# Altium schematic symbol library LATTICEPLDS_Library.SchLib: 291 symbols (part 7 of 32)
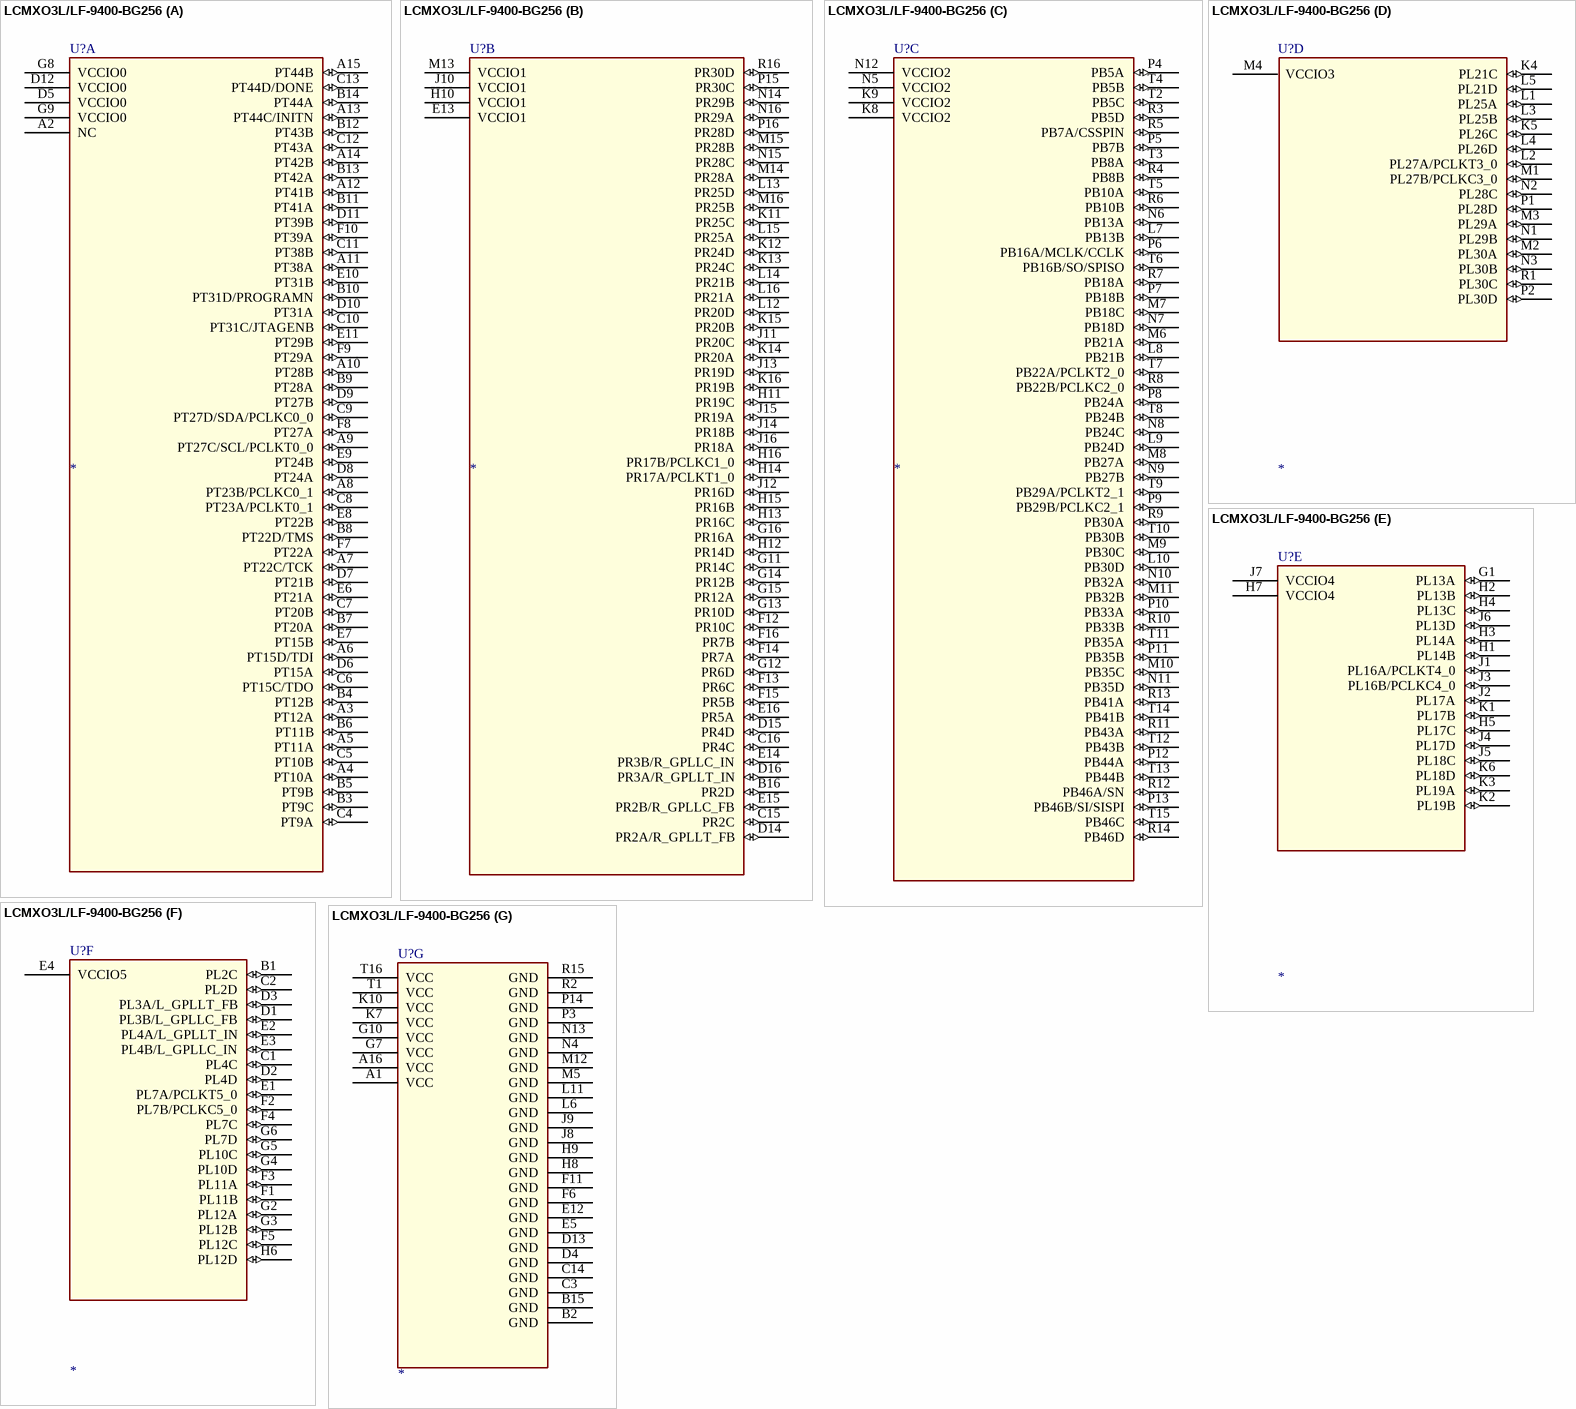
[diagram p309: symbol LCMXO3L/LF-9400-BG256]

## LCMXO3L/LF-9400-BG256
designator U?
SWAP_INFO: (S1+S2+S3+S4+S5+S6+S7); SPLIT_INST: TRUE
part A pins: A2 NC, A3 PT12A (io), A4 PT10A (io), A5 PT11A (io), A6 PT15D/TDI (io), A7 PT22C/TCK (io), A8 PT23B/PCLKC0_1 (io), A9 PT27C/SCL/PCLKT0_0 (io), A10 PT28B (io), A11 PT38A (io), A12 PT41B (io), A13 PT44C/INITN (io), A14 PT42B (io), A15 PT44B (io), B3 PT9C (io), B4 PT12B (io), B5 PT9B (io), B6 PT11B (io), B7 PT20A (io), B8 PT22D/TMS (io), B9 PT28A (io), B10 PT31D/PROGRAMN (io), B11 PT41A (io), B12 PT43B (io), B13 PT42A (io), B14 PT44A (io), C4 PT9A (io), C5 PT10B (io), C6 PT15C/TDO (io), C7 PT20B (io), C8 PT23A/PCLKT0_1 (io), C9 PT27D/SDA/PCLKC0_0 (io), C10 PT31C/JTAGENB (io), C11 PT38B (io), C12 PT43A (io), C13 PT44D/DONE (io), D5 VCCIO0 (power), D6 PT15A (io), D7 PT21B (io), D8 PT24A (io), D9 PT27B (io), D10 PT31A (io), D11 PT39B (io), D12 VCCIO0 (power), E6 PT21A (io), E7 PT15B (io), E8 PT22B (io), E9 PT24B (io), E10 PT31B (io), E11 PT29B (io), F7 PT22A (io), F8 PT27A (io), F9 PT29A (io), F10 PT39A (io), G8 VCCIO0 (power), G9 VCCIO0 (power)
part B pins: B16 PR2D (io), C15 PR2C (io), C16 PR4C (io), D14 PR2A/R_GPLLT_FB (io), D15 PR4D (io), D16 PR3A/R_GPLLT_IN (io), E13 VCCIO1 (power), E14 PR3B/R_GPLLC_IN (io), E15 PR2B/R_GPLLC_FB (io), E16 PR5A (io), F12 PR10C (io), F13 PR6C (io), F14 PR7A (io), F15 PR5B (io), F16 PR7B (io), G11 PR14C (io), G12 PR6D (io), G13 PR10D (io), G14 PR12B (io), G15 PR12A (io), G16 PR16A (io), H10 VCCIO1 (power), H11 PR19C (io), H12 PR14D (io), H13 PR16C (io), H14 PR17A/PCLKT1_0 (io), H15 PR16B (io), H16 PR17B/PCLKC1_0 (io), J10 VCCIO1 (power), J11 PR20C (io), J12 PR16D (io), J13 PR19D (io), J14 PR18B (io), J15 PR19A (io), J16 PR18A (io), K11 PR25C (io), K12 PR24D (io), K13 PR24C (io), K14 PR20A (io), K15 PR20B (io), K16 PR19B (io), L12 PR20D (io), L13 PR25D (io), L14 PR21B (io), L15 PR25A (io), L16 PR21A (io), M13 VCCIO1 (power), M14 PR28A (io), M15 PR28B (io), M16 PR25B (io), N14 PR29B (io), N15 PR28C (io), N16 PR29A (io), P15 PR30C (io), P16 PR28D (io), R16 PR30D (io)
part C pins: K8 VCCIO2 (power), K9 VCCIO2 (power), L7 PB13B (io), L8 PB21B (io), L9 PB24D (io), L10 PB30D (io), M6 PB21A (io), M7 PB18C (io), M8 PB27A (io), M9 PB30C (io), M10 PB35C (io), M11 PB32B (io), N5 VCCIO2 (power), N6 PB13A (io), N7 PB18D (io), N8 PB24C (io), N9 PB27B (io), N10 PB32A (io), N11 PB35D (io), N12 VCCIO2 (power), P4 PB5A (io), P5 PB7B (io), P6 PB16A/MCLK/CCLK (io), P7 PB18B (io), P8 PB24A (io), P9 PB29B/PCLKC2_1 (io), P10 PB33A (io), P11 PB35B (io), P12 PB44A (io), P13 PB46B/SI/SISPI (io), R3 PB5D (io), R4 PB8B (io), R5 PB7A/CSSPIN (io), R6 PB10B (io), R7 PB18A (io), R8 PB22B/PCLKC2_0 (io), R9 PB30A (io), R10 PB33B (io), R11 PB43A (io), R12 PB46A/SN (io), R13 PB41A (io), R14 PB46D (io), T2 PB5C (io), T3 PB8A (io), T4 PB5B (io), T5 PB10A (io), T6 PB16B/SO/SPISO (io), T7 PB22A/PCLKT2_0 (io), T8 PB24B (io), T9 PB29A/PCLKT2_1 (io), T10 PB30B (io), T11 PB35A (io), T12 PB43B (io), T13 PB44B (io), T14 PB41B (io), T15 PB46C (io)
part D pins: K4 PL21C (io), K5 PL26C (io), L1 PL25A (io), L2 PL27A/PCLKT3_0 (io), L3 PL25B (io), L4 PL26D (io), L5 PL21D (io), M1 PL27B/PCLKC3_0 (io), M2 PL30A (io), M3 PL29A (io), M4 VCCIO3 (power), N1 PL29B (io), N2 PL28C (io), N3 PL30B (io), P1 PL28D (io), P2 PL30D (io), R1 PL30C (io)
part E pins: G1 PL13A (io), H1 PL14B (io), H2 PL13B (io), H3 PL14A (io), H4 PL13C (io), H5 PL17C (io), H7 VCCIO4 (power), J1 PL16A/PCLKT4_0 (io), J2 PL17A (io), J3 PL16B/PCLKC4_0 (io), J4 PL17D (io), J5 PL18C (io), J6 PL13D (io), J7 VCCIO4 (power), K1 PL17B (io), K2 PL19B (io), K3 PL19A (io), K6 PL18D (io)
part F pins: B1 PL2C (io), C1 PL4C (io), C2 PL2D (io), D1 PL3B/L_GPLLC_FB (io), D2 PL4D (io), D3 PL3A/L_GPLLT_FB (io), E1 PL7A/PCLKT5_0 (io), E2 PL4A/L_GPLLT_IN (io), E3 PL4B/L_GPLLC_IN (io), E4 VCCIO5 (power), F1 PL11B (io), F2 PL7B/PCLKC5_0 (io), F3 PL11A (io), F4 PL7C (io), F5 PL12C (io), G2 PL12A (io), G3 PL12B (io), G4 PL10D (io), G5 PL10C (io), G6 PL7D (io), H6 PL12D (io)
part G pins: A1 VCC (power), A16 VCC (power), B2 GND (power), B15 GND (power), C3 GND (power), C14 GND (power), D4 GND (power), D13 GND (power), E5 GND (power), E12 GND (power), F6 GND (power), F11 GND (power), G7 VCC (power), G10 VCC (power), H8 GND (power), H9 GND (power), J8 GND (power), J9 GND (power), K7 VCC (power), K10 VCC (power), L6 GND (power), L11 GND (power), M5 GND (power), M12 GND (power), N4 GND (power), N13 GND (power), P3 GND (power), P14 GND (power), R2 GND (power), R15 GND (power), T1 VCC (power), T16 VCC (power)

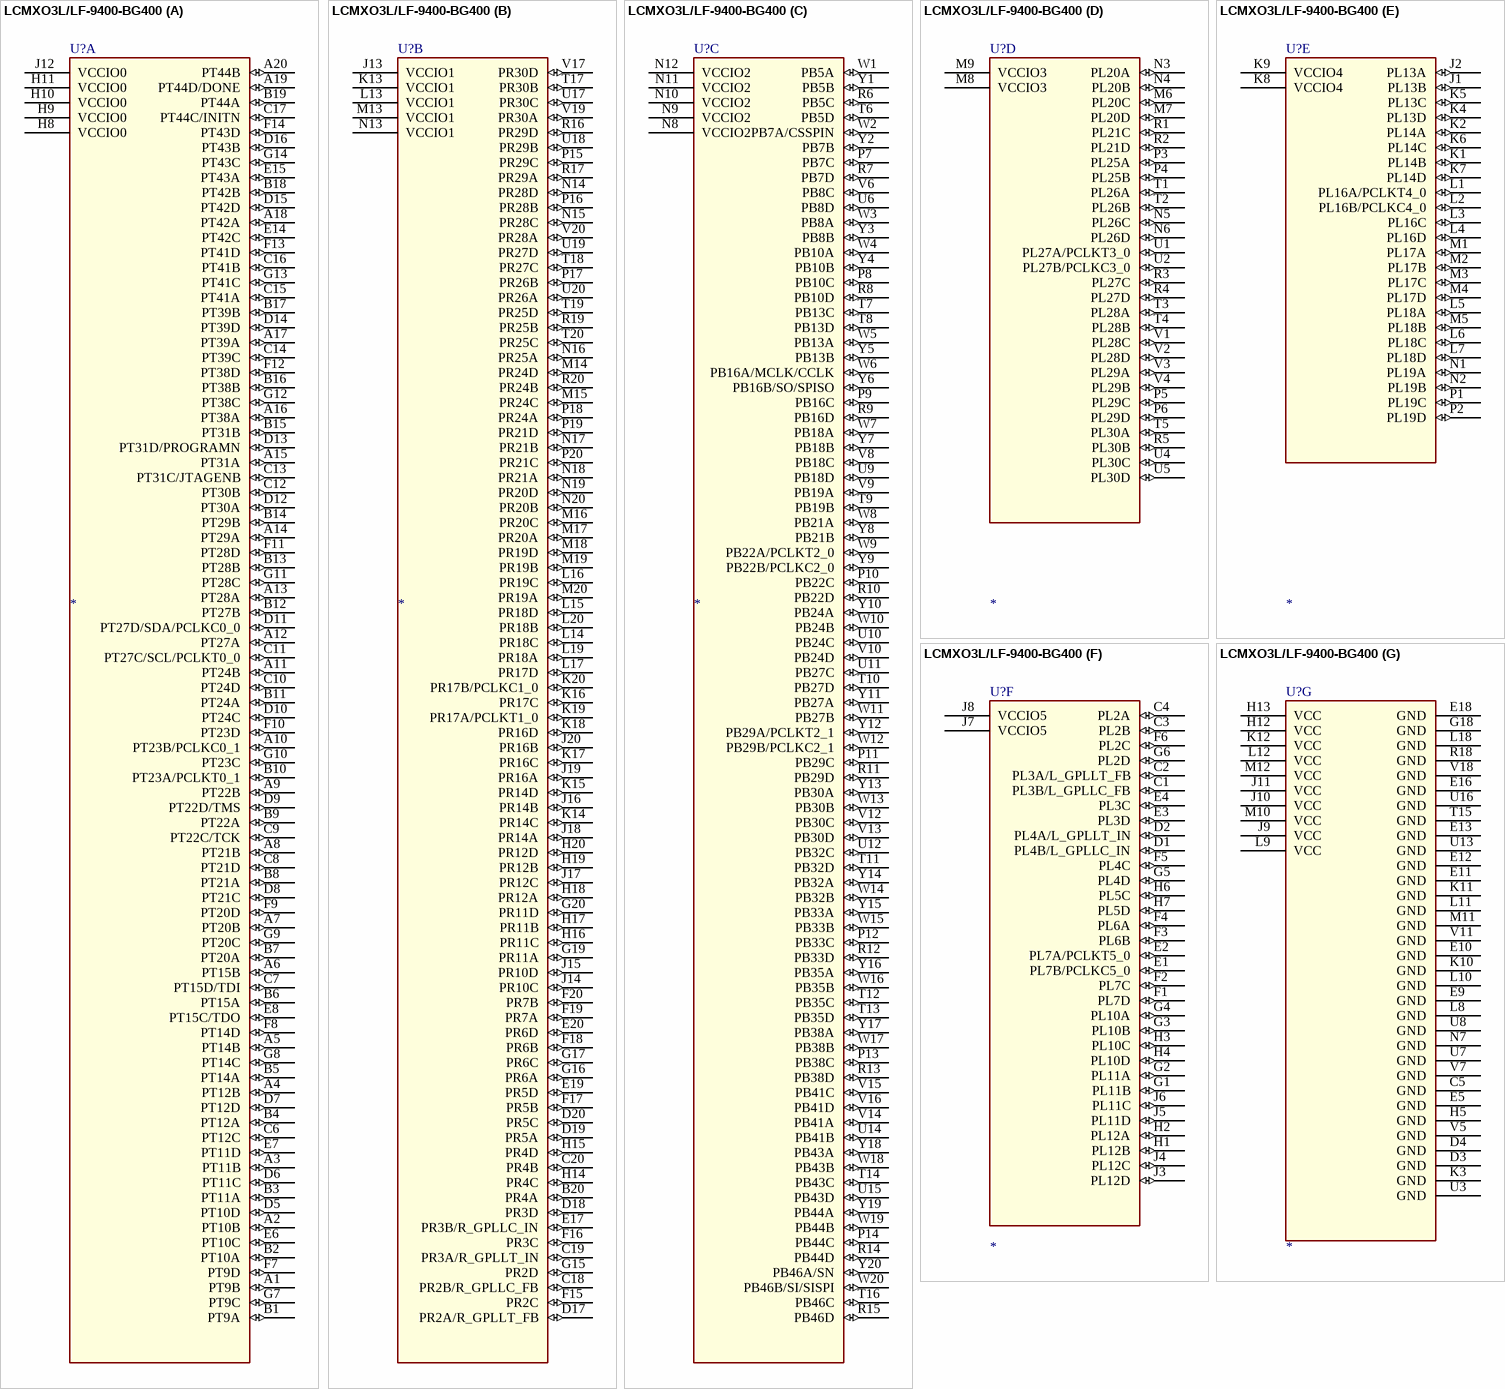
[diagram p65: symbol LCMXO3L/LF-9400-BG400]

## LCMXO3L/LF-9400-BG400
designator U?
SWAP_INFO: (S1+S2+S3+S4+S5+S6+S7); SPLIT_INST: TRUE
part A pins: A1 PT9B (io), A2 PT10B (io), A3 PT11B (io), A4 PT12B (io), A5 PT14B (io), A6 PT15B (io), A7 PT20B (io), A8 PT21B (io), A9 PT22B (io), A10 PT23B/PCLKC0_1 (io), A11 PT24B (io), A12 PT27A (io), A13 PT28A (io), A14 PT29A (io), A15 PT31A (io), A16 PT38A (io), A17 PT39A (io), A18 PT42A (io), A19 PT44D/DONE (io), A20 PT44B (io), B1 PT9A (io), B2 PT10A (io), B3 PT11A (io), B4 PT12A (io), B5 PT14A (io), B6 PT15A (io), B7 PT20A (io), B8 PT21A (io), B9 PT22A (io), B10 PT23A/PCLKT0_1 (io), B11 PT24A (io), B12 PT27B (io), B13 PT28B (io), B14 PT29B (io), B15 PT31B (io), B16 PT38B (io), B17 PT39B (io), B18 PT42B (io), B19 PT44A (io), C6 PT12C (io), C7 PT15D/TDI (io), C8 PT21D (io), C9 PT22C/TCK (io), C10 PT24D (io), C11 PT27C/SCL/PCLKT0_0 (io), C12 PT30B (io), C13 PT31C/JTAGENB (io), C14 PT39C (io), C15 PT41A (io), C16 PT41B (io), C17 PT44C/INITN (io), D5 PT10D (io), D6 PT11C (io), D7 PT12D (io), D8 PT21C (io), D9 PT22D/TMS (io), D10 PT24C (io), D11 PT27D/SDA/PCLKC0_0 (io), D12 PT30A (io), D13 PT31D/PROGRAMN (io), D14 PT39D (io), D15 PT42D (io), D16 PT43B (io), E6 PT10C (io), E7 PT11D (io), E8 PT15C/TDO (io), E14 PT42C (io), E15 PT43A (io), F7 PT9D (io), F8 PT14D (io), F9 PT20D (io), F10 PT23D (io), F11 PT28D (io), F12 PT38D (io), F13 PT41D (io), F14 PT43D (io), G7 PT9C (io), G8 PT14C (io), G9 PT20C (io), G10 PT23C (io), G11 PT28C (io), G12 PT38C (io), G13 PT41C (io), G14 PT43C (io), H8 VCCIO0 (power), H9 VCCIO0 (power), H10 VCCIO0 (power), H11 VCCIO0 (power), J12 VCCIO0 (power)
part B pins: B20 PR4A (io), C18 PR2B/R_GPLLC_FB (io), C19 PR3A/R_GPLLT_IN (io), C20 PR4B (io), D17 PR2A/R_GPLLT_FB (io), D18 PR3D (io), D19 PR5A (io), D20 PR5C (io), E17 PR3B/R_GPLLC_IN (io), E19 PR5D (io), E20 PR6D (io), F15 PR2C (io), F16 PR3C (io), F17 PR5B (io), F18 PR6B (io), F19 PR7A (io), F20 PR7B (io), G15 PR2D (io), G16 PR6A (io), G17 PR6C (io), G19 PR11A (io), G20 PR11D (io), H14 PR4C (io), H15 PR4D (io), H16 PR11C (io), H17 PR11B (io), H18 PR12A (io), H19 PR12B (io), H20 PR12D (io), J13 VCCIO1 (power), J14 PR10C (io), J15 PR10D (io), J16 PR14B (io), J17 PR12C (io), J18 PR14A (io), J19 PR16A (io), J20 PR16B (io), K13 VCCIO1 (power), K14 PR14C (io), K15 PR14D (io), K16 PR17C (io), K17 PR16C (io), K18 PR16D (io), K19 PR17A/PCLKT1_0 (io), K20 PR17B/PCLKC1_0 (io), L13 VCCIO1 (power), L14 PR18C (io), L15 PR18D (io), L16 PR19C (io), L17 PR17D (io), L19 PR18A (io), L20 PR18B (io), M13 VCCIO1 (power), M14 PR24D (io), M15 PR24C (io), M16 PR20C (io), M17 PR20A (io), M18 PR19D (io), M19 PR19B (io), M20 PR19A (io), N13 VCCIO1 (power), N14 PR28D (io), N15 PR28C (io), N16 PR25A (io), N17 PR21B (io), N18 PR21A (io), N19 PR20D (io), N20 PR20B (io), P15 PR29C (io), P16 PR28B (io), P17 PR26B (io), P18 PR24A (io), P19 PR21D (io), P20 PR21C (io), R16 PR29D (io), R17 PR29A (io), R19 PR25B (io), R20 PR24B (io), T17 PR30B (io), T18 PR27C (io), T19 PR25D (io), T20 PR25C (io), U17 PR30C (io), U18 PR29B (io), U19 PR27D (io), U20 PR26A (io), V17 PR30D (io), V19 PR30A (io), V20 PR28A (io)
part C pins: N8 VCCIO2 (power), N9 VCCIO2 (power), N10 VCCIO2 (power), N11 VCCIO2 (power), N12 VCCIO2 (power), P7 PB7C (io), P8 PB10C (io), P9 PB16C (io), P10 PB22C (io), P11 PB29C (io), P12 PB33C (io), P13 PB38C (io), P14 PB44C (io), R6 PB5C (io), R7 PB7D (io), R8 PB10D (io), R9 PB16D (io), R10 PB22D (io), R11 PB29D (io), R12 PB33D (io), R13 PB38D (io), R14 PB44D (io), R15 PB46D (io), T6 PB5D (io), T7 PB13C (io), T8 PB13D (io), T9 PB19B (io), T10 PB27D (io), T11 PB32D (io), T12 PB35C (io), T13 PB35D (io), T14 PB43C (io), T16 PB46C (io), U6 PB8D (io), U9 PB18D (io), U10 PB24C (io), U11 PB27C (io), U12 PB32C (io), U14 PB41B (io), U15 PB43D (io), V6 PB8C (io), V8 PB18C (io), V9 PB19A (io), V10 PB24D (io), V12 PB30C (io), V13 PB30D (io), V14 PB41A (io), V15 PB41C (io), V16 PB41D (io), W1 PB5A (io), W2 PB7A/CSSPIN (io), W3 PB8A (io), W4 PB10A (io), W5 PB13A (io), W6 PB16A/MCLK/CCLK (io), W7 PB18A (io), W8 PB21A (io), W9 PB22A/PCLKT2_0 (io), W10 PB24B (io), W11 PB27B (io), W12 PB29B/PCLKC2_1 (io), W13 PB30B (io), W14 PB32B (io), W15 PB33B (io), W16 PB35B (io), W17 PB38B (io), W18 PB43B (io), W19 PB44B (io), W20 PB46B/SI/SISPI (io), Y1 PB5B (io), Y2 PB7B (io), Y3 PB8B (io), Y4 PB10B (io), Y5 PB13B (io), Y6 PB16B/SO/SPISO (io), Y7 PB18B (io), Y8 PB21B (io), Y9 PB22B/PCLKC2_0 (io), Y10 PB24A (io), Y11 PB27A (io), Y12 PB29A/PCLKT2_1 (io), Y13 PB30A (io), Y14 PB32A (io), Y15 PB33A (io), Y16 PB35A (io), Y17 PB38A (io), Y18 PB43A (io), Y19 PB44A (io), Y20 PB46A/SN (io)
part D pins: M6 PL20C (io), M7 PL20D (io), M8 VCCIO3 (power), M9 VCCIO3 (power), N3 PL20A (io), N4 PL20B (io), N5 PL26C (io), N6 PL26D (io), P3 PL25A (io), P4 PL25B (io), P5 PL29C (io), P6 PL29D (io), R1 PL21C (io), R2 PL21D (io), R3 PL27C (io), R4 PL27D (io), R5 PL30B (io), T1 PL26A (io), T2 PL26B (io), T3 PL28A (io), T4 PL28B (io), T5 PL30A (io), U1 PL27A/PCLKT3_0 (io), U2 PL27B/PCLKC3_0 (io), U4 PL30C (io), U5 PL30D (io), V1 PL28C (io), V2 PL28D (io), V3 PL29A (io), V4 PL29B (io)
part E pins: J1 PL13B (io), J2 PL13A (io), K1 PL14B (io), K2 PL14A (io), K4 PL13D (io), K5 PL13C (io), K6 PL14C (io), K7 PL14D (io), K8 VCCIO4 (power), K9 VCCIO4 (power), L1 PL16A/PCLKT4_0 (io), L2 PL16B/PCLKC4_0 (io), L3 PL16C (io), L4 PL16D (io), L5 PL18A (io), L6 PL18C (io), L7 PL18D (io), M1 PL17A (io), M2 PL17B (io), M3 PL17C (io), M4 PL17D (io), M5 PL18B (io), N1 PL19A (io), N2 PL19B (io), P1 PL19C (io), P2 PL19D (io)
part F pins: C1 PL3B/L_GPLLC_FB (io), C2 PL3A/L_GPLLT_FB (io), C3 PL2B (io), C4 PL2A (io), D1 PL4B/L_GPLLC_IN (io), D2 PL4A/L_GPLLT_IN (io), E1 PL7B/PCLKC5_0 (io), E2 PL7A/PCLKT5_0 (io), E3 PL3D (io), E4 PL3C (io), F1 PL7D (io), F2 PL7C (io), F3 PL6B (io), F4 PL6A (io), F5 PL4C (io), F6 PL2C (io), G1 PL11B (io), G2 PL11A (io), G3 PL10B (io), G4 PL10A (io), G5 PL4D (io), G6 PL2D (io), H1 PL12B (io), H2 PL12A (io), H3 PL10C (io), H4 PL10D (io), H6 PL5C (io), H7 PL5D (io), J3 PL12D (io), J4 PL12C (io), J5 PL11D (io), J6 PL11C (io), J7 VCCIO5 (power), J8 VCCIO5 (power)
part G pins: C5 GND (power), D3 GND (power), D4 GND (power), E5 GND (power), E9 GND (power), E10 GND (power), E11 GND (power), E12 GND (power), E13 GND (power), E16 GND (power), E18 GND (power), G18 GND (power), H5 GND (power), H12 VCC (power), H13 VCC (power), J9 VCC (power), J10 VCC (power), J11 VCC (power), K3 GND (power), K10 GND (power), K11 GND (power), K12 VCC (power), L8 GND (power), L9 VCC (power), L10 GND (power), L11 GND (power), L12 VCC (power), L18 GND (power), M10 VCC (power), M11 GND (power), M12 VCC (power), N7 GND (power), R18 GND (power), T15 GND (power), U3 GND (power), U7 GND (power), U8 GND (power), U13 GND (power), U16 GND (power), V5 GND (power), V7 GND (power), V11 GND (power), V18 GND (power)

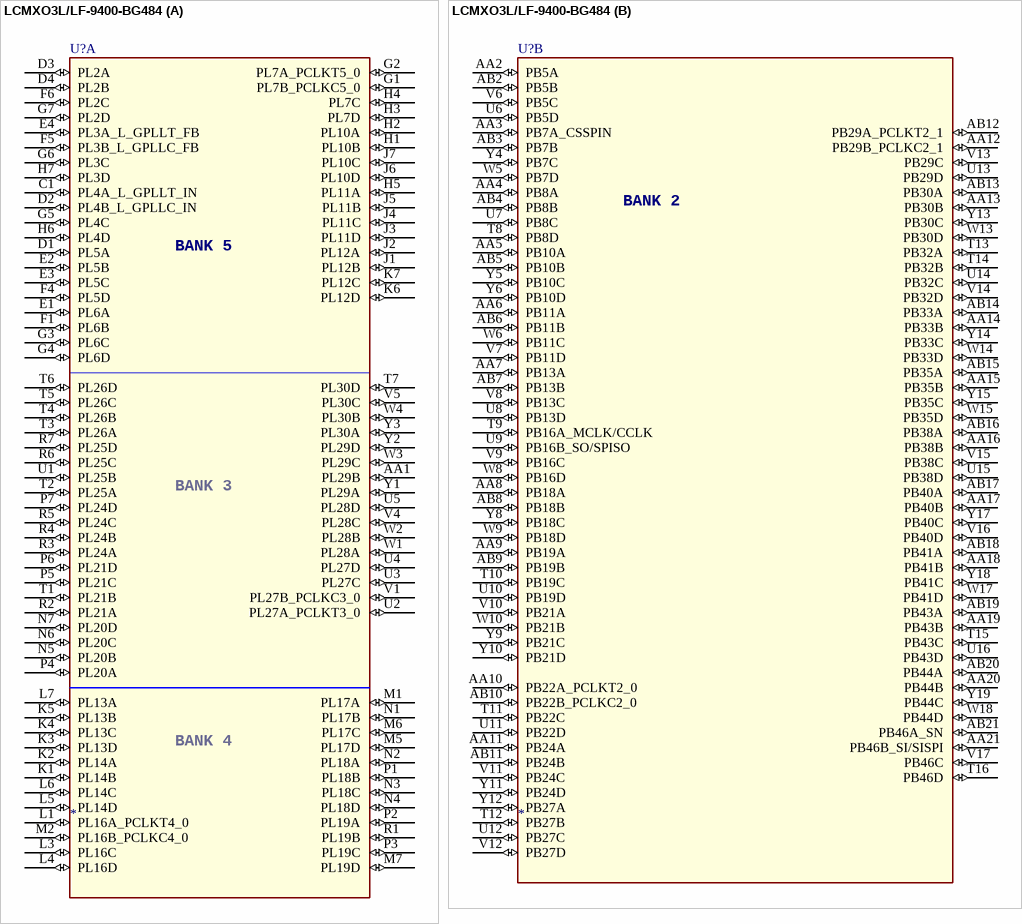
[diagram p66: symbol LCMXO3L/LF-9400-BG484]

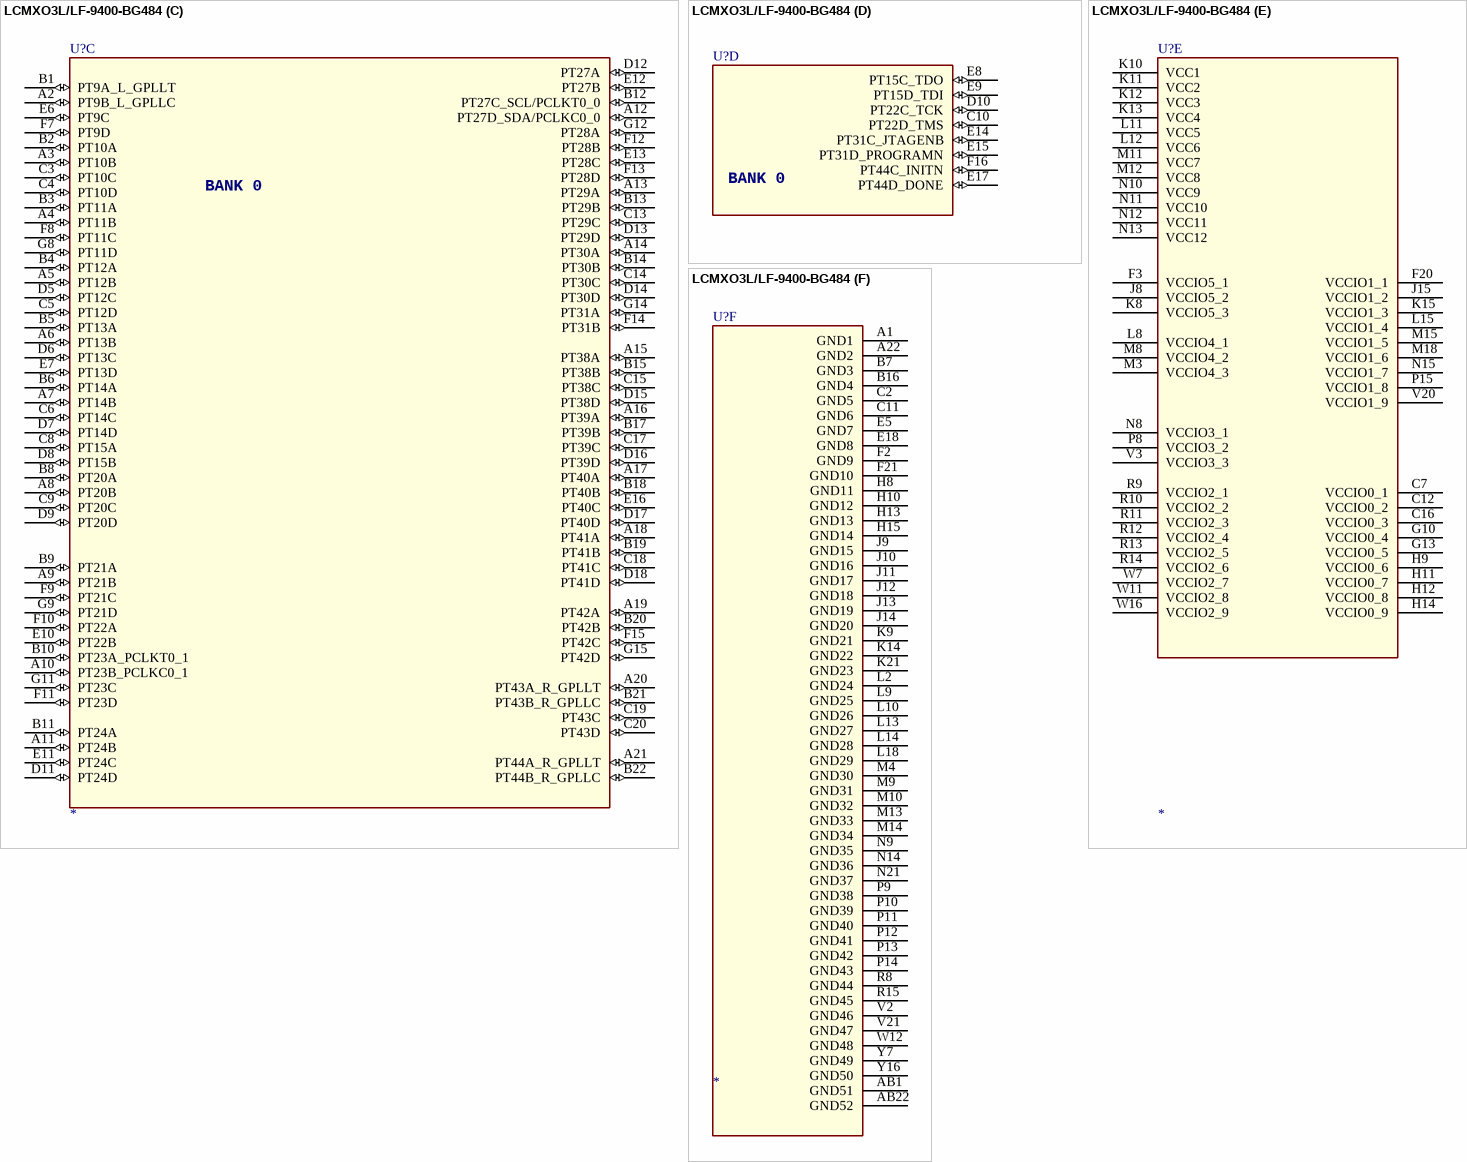
[diagram p67: symbol LCMXO3L/LF-9400-BG484]

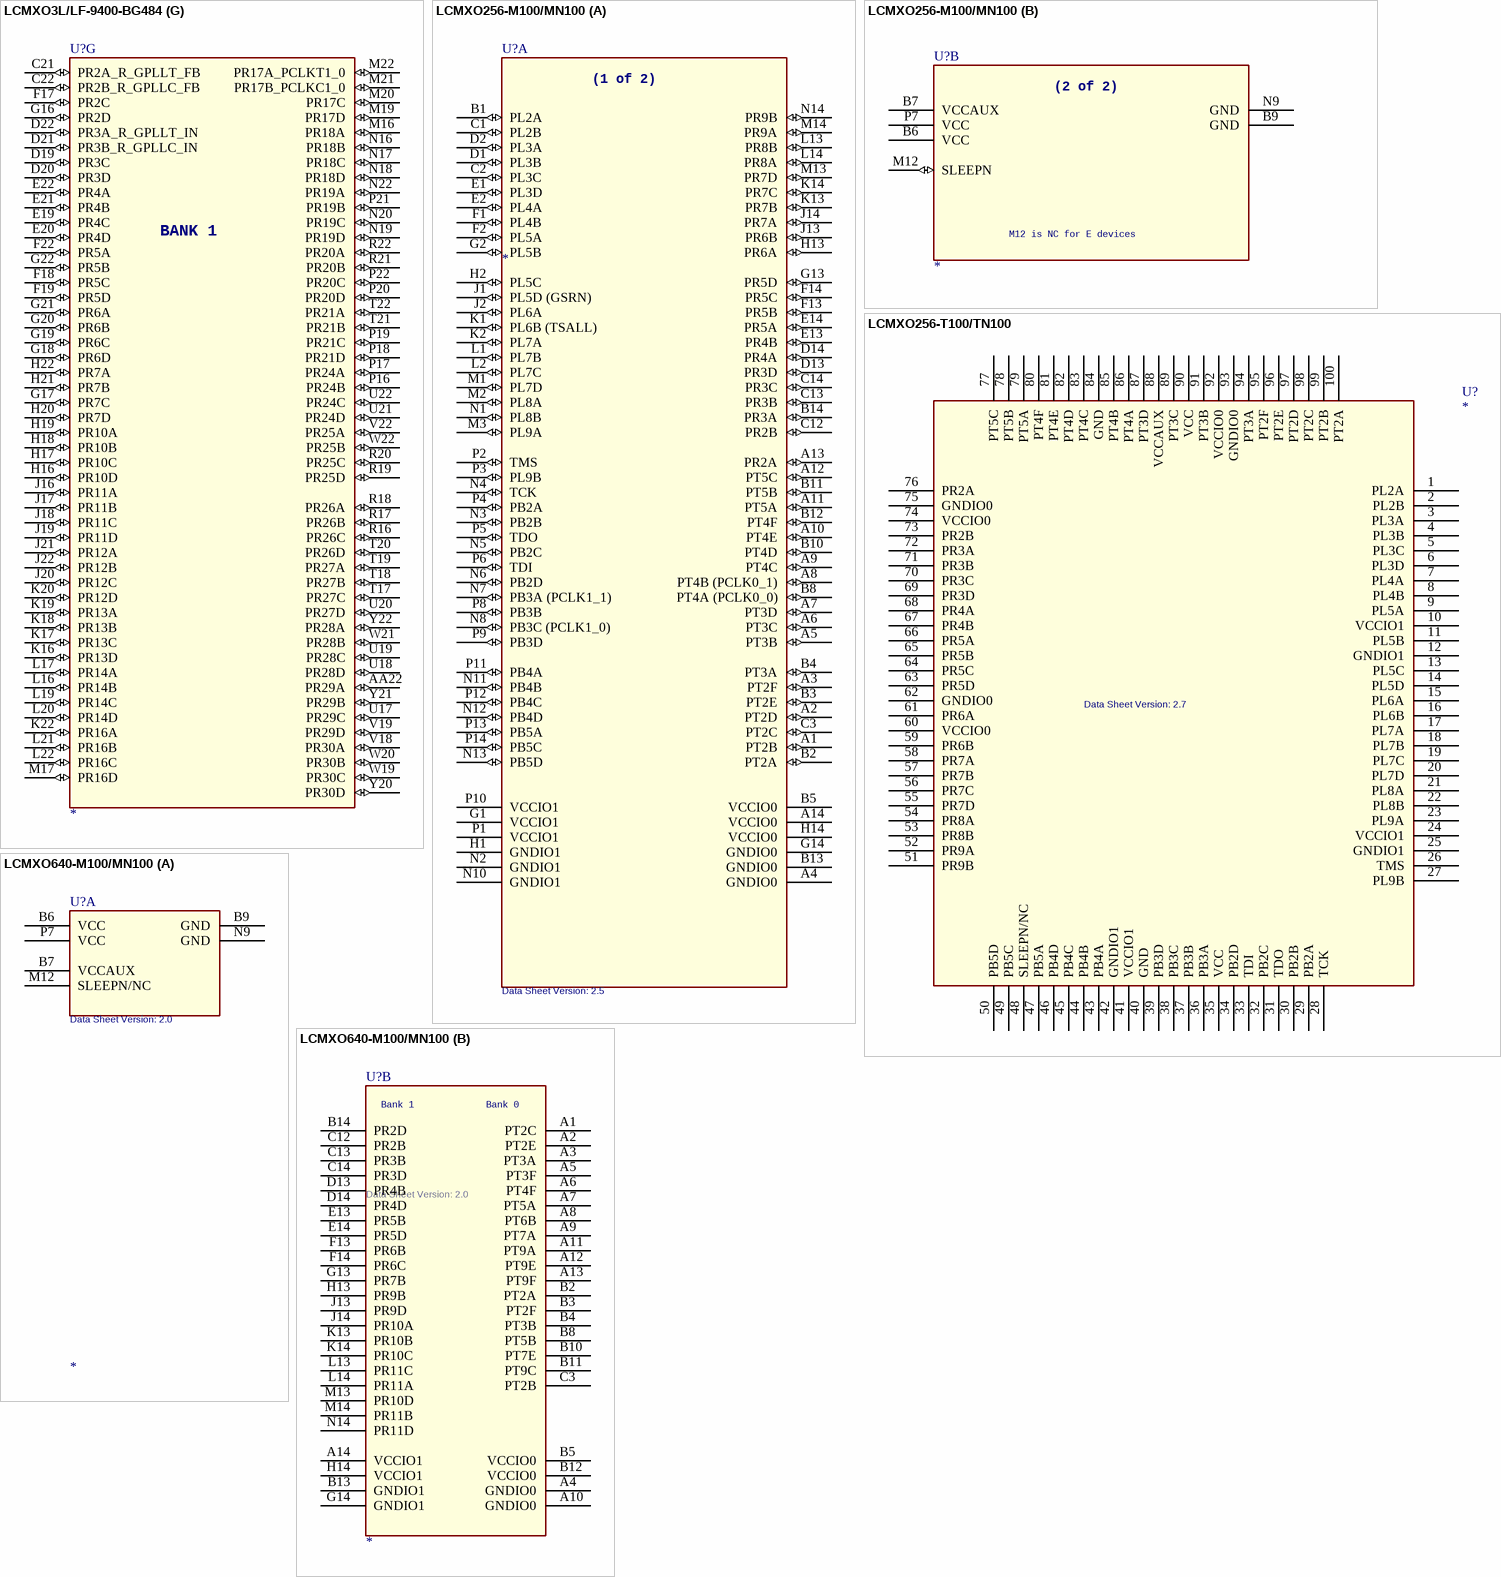
[diagram p68: symbols LCMXO3L/LF-9400-BG484 to LCMXO640-M100/MN100]

## LCMXO3L/LF-9400-BG484
designator U?
SWAP_INFO: (S1+S2+S3+S4+S5+S6+S7+S8); SPLIT_INST: TRUE
footprint BGA484-080
part A pins: AA1 PL29B (io), C1 PL4A_L_GPLLT_IN (io), D1 PL5A (io), D2 PL4B_L_GPLLC_IN (io), D3 PL2A (io), D4 PL2B (io), E1 PL6A (io), E2 PL5B (io), E3 PL5C (io), E4 PL3A_L_GPLLT_FB (io), F1 PL6B (io), F4 PL5D (io), F5 PL3B_L_GPLLC_FB (io), F6 PL2C (io), G1 PL7B_PCLKC5_0 (io), G2 PL7A_PCLKT5_0 (io), G3 PL6C (io), G4 PL6D (io), G5 PL4C (io), G6 PL3C (io), G7 PL2D (io), H1 PL10B (io), H2 PL10A (io), H3 PL7D (io), H4 PL7C (io), H5 PL11A (io), H6 PL4D (io), H7 PL3D (io), J1 PL12B (io), J2 PL12A (io), J3 PL11D (io), J4 PL11C (io), J5 PL11B (io), J6 PL10D (io), J7 PL10C (io), K1 PL14B (io), K2 PL14A (io), K3 PL13D (io), K4 PL13C (io), K5 PL13B (io), K6 PL12D (io), K7 PL12C (io), L1 PL16A_PCLKT4_0 (io), L3 PL16C (io), L4 PL16D (io), L5 PL14D (io), L6 PL14C (io), L7 PL13A (io), M1 PL17A (io), M2 PL16B_PCLKC4_0 (io), M5 PL17D (io), M6 PL17C (io), M7 PL19D (io), N1 PL17B (io), N2 PL18A (io), N3 PL18C (io), N4 PL18D (io), N5 PL20B (io), N6 PL20C (io), N7 PL20D (io), P1 PL18B (io), P2 PL19A (io), P3 PL19C (io), P4 PL20A (io), P5 PL21C (io), P6 PL21D (io), P7 PL24D (io), R1 PL19B (io), R2 PL21A (io), R3 PL24A (io), R4 PL24B (io), R5 PL24C (io), R6 PL25C (io), R7 PL25D (io), T1 PL21B (io), T2 PL25A (io), T3 PL26A (io), T4 PL26B (io), T5 PL26C (io), T6 PL26D (io), T7 PL30D (io), U1 PL25B (io), U2 PL27A_PCLKT3_0 (io), U3 PL27C (io), U4 PL27D (io), U5 PL28D (io), V1 PL27B_PCLKC3_0 (io), V4 PL28C (io), V5 PL30C (io), W1 PL28A (io), W2 PL28B (io), W3 PL29C (io), W4 PL30B (io), Y1 PL29A (io), Y2 PL29D (io), Y3 PL30A (io)
part B pins: AA2 PB5A (io), AA3 PB7A_CSSPIN (io), AA4 PB8A (io), AA5 PB10A (io), AA6 PB11A (io), AA7 PB13A (io), AA8 PB18A (io), AA9 PB19A (io), AA10 PB22A_PCLKT2_0 (io), AA11 PB24A (io), AA12 PB29B_PCLKC2_1 (io), AA13 PB30B (io), AA14 PB33B (io), AA15 PB35B (io), AA16 PB38B (io), AA17 PB40B (io), AA18 PB41B (io), AA19 PB43B (io), AA20 PB44B (io), AA21 PB46B_SI/SISPI (io), AB2 PB5B (io), AB3 PB7B (io), AB4 PB8B (io), AB5 PB10B (io), AB6 PB11B (io), AB7 PB13B (io), AB8 PB18B (io), AB9 PB19B (io), AB10 PB22B_PCLKC2_0 (io), AB11 PB24B (io), AB12 PB29A_PCLKT2_1 (io), AB13 PB30A (io), AB14 PB33A (io), AB15 PB35A (io), AB16 PB38A (io), AB17 PB40A (io), AB18 PB41A (io), AB19 PB43A (io), AB20 PB44A (io), AB21 PB46A_SN (io), T8 PB8D (io), T9 PB16A_MCLK/CCLK (io), T10 PB19C (io), T11 PB22C (io), T12 PB27B (io), T13 PB32A (io), T14 PB32B (io), T15 PB43C (io), T16 PB46D (io), U6 PB5D (io), U7 PB8C (io), U8 PB13D (io), U9 PB16B_SO/SPISO (io), U10 PB19D (io), U11 PB22D (io), U12 PB27C (io), U13 PB29D (io), U14 PB32C (io), U15 PB38D (io), U16 PB43D (io), V6 PB5C (io), V7 PB11D (io), V8 PB13C (io), V9 PB16C (io), V10 PB21A (io), V11 PB24C (io), V12 PB27D (io), V13 PB29C (io), V14 PB32D (io), V15 PB38C (io), V16 PB40D (io), V17 PB46C (io), W5 PB7D (io), W6 PB11C (io), W8 PB16D (io), W9 PB18D (io), W10 PB21B (io), W13 PB30D (io), W14 PB33D (io), W15 PB35D (io), W17 PB41D (io), W18 PB44D (io), Y4 PB7C (io), Y5 PB10C (io), Y6 PB10D (io), Y8 PB18C (io), Y9 PB21C (io), Y10 PB21D (io), Y11 PB24D (io), Y12 PB27A (io), Y13 PB30C (io), Y14 PB33C (io), Y15 PB35C (io), Y17 PB40C (io), Y18 PB41C (io), Y19 PB44C (io)